# Altium footprint library PHOENIX THD.PcbLib: 109 footprints (part 7 of 8) (continued)
## PHOENIX_1803442 [mm] "PCB Header, 8A, 160 V, Pitch: 3.81mm, 4 Positions, MCV Serie" (continued)
Mechanical 14:
  drawing of 161 lines, arcs and shapes, not listed
3D body "PHOENIX_1803442.stp": height 9.2, standoff -3.4, extent -8.315,-3 8.315,4.25

## PHOENIX_1803455 [mm] "PCB Header, 8A, 160 V, Pitch: 3.81mm, 5 Positions, MCV Serie"
height 9.2
pads (5):
  round 1.9 hole 1.2: 1(-7.62,0) 2(-3.81,0) 3(0,0) 4(3.81,0) 5(7.62,0)
Top Overlay:
  drawing of 176 lines, arcs and shapes, not listed
  text "5" at 7.345,4.6 h1
  text "4" at 3.535,4.6 h1
  text "3" at -0.275,4.6 h1
  text "2" at -4.085,4.6 h1
  text "1" at -7.895,4.6 h1
Mechanical 8:
  lines w0.1: -8.12,0 -7.62,0 ; -7.62,-0.5 -7.62,0 ; -7.62,0.5 -7.62,0 ; -7.12,0 -7.62,0 ; -4.31,0 -3.81,0 ; -3.81,-0.5 -3.81,0 ; -3.81,0.5 -3.81,0 ; -3.31,0 -3.81,0 ; -0.5,0 0,0 ; 0,-0.5 0,0 ; 0,0.5 0,0 ; 0.5,0 0,0 ; 3.31,0 3.81,0 ; 3.81,-0.5 3.81,0 ; 3.81,0.5 3.81,0 ; 4.31,0 3.81,0 ; 7.12,0 7.62,0 ; 7.62,-0.5 7.62,0 ; 7.62,0.5 7.62,0 ; 8.12,0 7.62,0
Mechanical 14:
  drawing of 202 lines, arcs and shapes, not listed
3D body "PHOENIX_1803455.stp": height 9.2, standoff -3.4, extent -10.22,-3 10.22,4.25

## PHOENIX_1803468 [mm] "PCB Header, 8A, 160 V, Pitch: 3.81mm, 6 Positions, MCV Serie"
height 9.2
pads (6):
  round 1.9 hole 1.2: 1(-9.525,0) 2(-5.715,0) 3(-1.905,0) 4(1.905,0) 5(5.715,0) 6(9.525,0)
Top Overlay:
  drawing of 218 lines, arcs and shapes, not listed
  text "1" at -9.8,4.6 h1
  text "2" at -5.99,4.6 h1
  text "3" at -2.18,4.6 h1
  text "4" at 1.63,4.6 h1
  text "5" at 5.44,4.6 h1
  text "6" at 9.25,4.6 h1
Mechanical 8:
  lines w0.1: -10.025,0 -9.525,0 ; -9.525,-0.5 -9.525,0 ; -9.525,0.5 -9.525,0 ; -9.025,0 -9.525,0 ; -6.215,0 -5.715,0 ; -5.715,-0.5 -5.715,0 ; -5.715,0.5 -5.715,0 ; -5.215,0 -5.715,0 ; -2.405,0 -1.905,0 ; -1.905,-0.5 -1.905,0 ; -1.905,0.5 -1.905,0 ; -1.405,0 -1.905,0 ; -0.5,0 0,0 ; 0,-0.5 0,0 ; 0,0.5 0,0 ; 0.5,0 0,0 ; 1.405,0 1.905,0 ; 1.905,-0.5 1.905,0 ; 1.905,0.5 1.905,0 ; 2.405,0 1.905,0 ; 5.215,0 5.715,0 ; 5.715,-0.5 5.715,0 ; 5.715,0.5 5.715,0 ; 6.215,0 5.715,0 ; 9.025,0 9.525,0 ; 9.525,-0.5 9.525,0 ; 9.525,0.5 9.525,0 ; 10.025,0 9.525,0
Mechanical 14:
  drawing of 409 lines, arcs and shapes, not listed
3D body "PHOENIX_1803468.stp": height 9.2, standoff -3.4, extent -12.125,-3 12.125,4.25

## PHOENIX_1803484 [mm] "PCB Header, 8A, 160 V, Pitch: 3.81mm, 8 Positions, MCV Serie"
height 9.2
pads (8):
  round 1.9 hole 1.2: 1(-13.335,0) 2(-9.525,0) 3(-5.715,0) 4(-1.905,0) 5(1.905,0) 6(5.715,0) 7(9.525,0) 8(13.335,0)
Top Overlay:
  drawing of 290 lines, arcs and shapes, not listed
  text "8" at 13.06,4.6 h1
  text "7" at 9.25,4.6 h1
  text "1" at -13.61,4.6 h1
  text "2" at -9.8,4.6 h1
  text "3" at -5.99,4.6 h1
  text "4" at -2.18,4.6 h1
  text "5" at 1.63,4.6 h1
  text "6" at 5.44,4.6 h1
Mechanical 8:
  lines w0.1: -13.835,0 -13.335,0 ; -13.335,-0.5 -13.335,0 ; -13.335,0.5 -13.335,0 ; -12.835,0 -13.335,0 ; -10.025,0 -9.525,0 ; -9.525,-0.5 -9.525,0 ; -9.525,0.5 -9.525,0 ; -9.025,0 -9.525,0 ; -6.215,0 -5.715,0 ; -5.715,-0.5 -5.715,0 ; -5.715,0.5 -5.715,0 ; -5.215,0 -5.715,0 ; -2.405,0 -1.905,0 ; -1.905,-0.5 -1.905,0 ; -1.905,0.5 -1.905,0 ; -1.405,0 -1.905,0 ; -0.5,0 0,0 ; 0,-0.5 0,0 ; 0,0.5 0,0 ; 0.5,0 0,0 ; 1.405,0 1.905,0 ; 1.905,-0.5 1.905,0 ; 1.905,0.5 1.905,0 ; 2.405,0 1.905,0 ; 5.215,0 5.715,0 ; 5.715,-0.5 5.715,0 ; 5.715,0.5 5.715,0 ; 6.215,0 5.715,0 ; 9.025,0 9.525,0 ; 9.525,-0.5 9.525,0 ; 9.525,0.5 9.525,0 ; 10.025,0 9.525,0 ; 12.835,0 13.335,0 ; 13.335,-0.5 13.335,0 ; 13.335,0.5 13.335,0 ; 13.835,0 13.335,0
Mechanical 14:
  drawing of 492 lines, arcs and shapes, not listed
3D body "PHOENIX_1803484.stp": height 9.2, standoff -3.4, extent -15.935,-3 15.935,4.25

## PHOENIX_1804687 [mm] "PCB Header, 20A, 630V, Pitch: 7.62mm, 2 Positions, PCV Serie"
height 29
pads (4):
  round 2 hole 1.3: 1(-3.81,-3.81) 1(-3.81,3.81) 2(3.81,-3.81) 2(3.81,3.81)
Top Overlay:
  circle w0.2: c3.81,-0.01 r1.6
  lines w0.2: -5.329,5.39 -5.329,5.583 ccw(c-5.522,5.583) -5.374,5.708 -5.614,5.993 cw(c-5.466,6.118) -5.466,6.311 -2.154,6.311 cw(c-2.154,6.118) -2.006,5.993 -2.246,5.708 ccw(c-2.098,5.583) -2.291,5.583 -2.291,5.39 ; -5.26,-0.41 -5.01,-0.16 ; -5.26,0.39 -5.01,0.14 ; -5.26,6.311 -5.26,5.39 -6.91,5.39 -6.91,-3.86 -5.159,-3.86 ; -4.61,-0.41 -4.61,-1.396 ccw(c-3.81,-0.01) -4.61,1.376 -4.61,0.39 ; -2.461,-3.86 -0.435,-3.86 -0.435,5.39 -2.36,5.39 -2.36,6.311 ; -2.36,-0.41 -2.61,-0.16 ; -2.36,0.39 -2.61,0.14 ; 2.291,5.39 2.291,5.583 ccw(c2.098,5.583) 2.246,5.708 2.006,5.993 cw(c2.154,6.118) 2.154,6.311 5.466,6.311 cw(c5.466,6.118) 5.614,5.993 5.374,5.708 ccw(c5.522,5.583) 5.329,5.583 5.329,5.39 ; 2.36,-0.41 2.61,-0.16 ; 2.36,0.39 2.61,0.14 ; 2.36,6.311 2.36,5.39 0.435,5.39 0.435,-3.86 2.461,-3.86 ; 5.159,-3.86 6.91,-3.86 6.91,5.39 5.26,5.39 5.26,6.311 ; 5.26,-0.41 5.01,-0.16 ; 5.26,0.39 5.01,0.14 ; -5.01,-0.16 -5.01,0.14 ; -5.01,-0.16 -2.61,-0.16 ; -5.01,0.14 -2.61,0.14 ; -2.61,-0.16 -2.61,0.14 ; 2.61,-0.16 2.61,0.14 ; 2.61,-0.16 5.01,-0.16 ; 2.61,0.14 5.01,0.14 ; 5.01,-0.16 5.01,0.14 ; -7.61,-6.41 -7.61,7.84 7.61,7.84 7.61,-6.41 -7.61,-6.41 ; -5.31,-0.41 -5.31,0.39 -2.31,0.39 -2.31,-0.41 -5.31,-0.41 ; -0.201,-0.76 0.201,-0.76 0,-0.01 -0.201,-0.76 ; -0.201,7.004 0,6.69 0.201,7.004 -0.201,7.004 ; 2.31,-0.41 2.31,0.39 5.31,0.39 5.31,-0.41 2.31,-0.41
  text "2" at 3.535,8.41 h1
  text "1" at -4.085,8.41 h1
Mechanical 8:
  lines w0.1: -4.31,-3.81 -3.81,-3.81 ; -4.31,3.81 -3.81,3.81 ; -3.81,-4.31 -3.81,-3.81 ; -3.81,-3.31 -3.81,-3.81 ; -3.81,3.31 -3.81,3.81 ; -3.81,4.31 -3.81,3.81 ; -3.31,-3.81 -3.81,-3.81 ; -3.31,3.81 -3.81,3.81 ; -0.5,0 0,0 ; 0,-0.5 0,0 ; 0,0.5 0,0 ; 0.5,0 0,0 ; 3.31,-3.81 3.81,-3.81 ; 3.31,3.81 3.81,3.81 ; 3.81,-4.31 3.81,-3.81 ; 3.81,-3.31 3.81,-3.81 ; 3.81,3.31 3.81,3.81 ; 3.81,4.31 3.81,3.81 ; 4.31,-3.81 3.81,-3.81 ; 4.31,3.81 3.81,3.81
Mechanical 14:
  circle w0.1: c3.81,-0.01 r1.6
  lines w0.1: -5.329,5.39 -5.329,5.583 ccw(c-5.522,5.583) -5.374,5.708 -5.614,5.993 cw(c-5.466,6.118) -5.466,6.311 -2.154,6.311 cw(c-2.154,6.118) -2.006,5.993 -2.246,5.708 ccw(c-2.098,5.583) -2.291,5.583 -2.291,5.39 ; -5.26,-0.41 -5.01,-0.16 ; -5.26,0.39 -5.01,0.14 ; -5.26,6.311 -5.26,5.39 -6.91,5.39 -6.91,-3.86 -0.435,-3.86 -0.435,5.39 -2.36,5.39 -2.36,6.311 ; -4.61,-0.41 -4.61,-1.396 ccw(c-3.81,-0.01) -4.61,1.376 -4.61,0.39 ; -2.36,-0.41 -2.61,-0.16 ; -2.36,0.39 -2.61,0.14 ; 2.291,5.39 2.291,5.583 ccw(c2.098,5.583) 2.246,5.708 2.006,5.993 cw(c2.154,6.118) 2.154,6.311 5.466,6.311 cw(c5.466,6.118) 5.614,5.993 5.374,5.708 ccw(c5.522,5.583) 5.329,5.583 5.329,5.39 ; 2.36,-0.41 2.61,-0.16 ; 2.36,0.39 2.61,0.14 ; 2.36,6.311 2.36,5.39 0.435,5.39 0.435,-3.86 6.91,-3.86 6.91,5.39 5.26,5.39 5.26,6.311 ; 5.26,-0.41 5.01,-0.16 ; 5.26,0.39 5.01,0.14 ; -5.01,-0.16 -5.01,0.14 ; -5.01,-0.16 -2.61,-0.16 ; -5.01,0.14 -2.61,0.14 ; -2.61,-0.16 -2.61,0.14 ; 2.61,-0.16 2.61,0.14 ; 2.61,-0.16 5.01,-0.16 ; 2.61,0.14 5.01,0.14 ; 5.01,-0.16 5.01,0.14 ; -7.61,-6.41 -7.61,7.84 7.61,7.84 7.61,-6.41 -7.61,-6.41 ; -5.31,-0.41 -5.31,0.39 -2.31,0.39 -2.31,-0.41 -5.31,-0.41 ; -0.201,-0.76 0.201,-0.76 0,-0.01 -0.201,-0.76 ; -0.201,7.004 0,6.69 0.201,7.004 -0.201,7.004 ; 2.31,-0.41 2.31,0.39 5.31,0.39 5.31,-0.41 2.31,-0.41
  text "1" at -4.085,8.41 h1
  text "2" at 3.535,8.41 h1
3D body "PHOENIX_1804687.stp": height 29, standoff -5, extent -7.61,-6.41 7.61,7.84

## PHOENIX_1804690 [mm] "PCB Header, 20A, 630V, Pitch: 7.62mm, 3 Positions, PCV Serie"
height 29
pads (6):
  round 2 hole 1.3: 1(-7.62,-3.81) 1(-7.62,3.81) 2(0,-3.81) 2(0,3.81) 3(7.62,-3.81) 3(7.62,3.81)
Top Overlay:
  lines w0.2: -9.138,5.39 -9.138,5.584 ccw(c-9.332,5.584) -9.184,5.708 -9.424,5.993 cw(c-9.276,6.118) -9.276,6.311 -5.963,6.311 cw(c-5.963,6.118) -5.816,5.993 -6.056,5.708 ccw(c-5.908,5.584) -6.101,5.584 -6.101,5.39 ; -9.019,-3.86 -10.72,-3.86 -10.72,5.39 -9.07,5.39 -9.07,6.311 -6.17,6.311 -6.17,5.39 -4.245,5.39 -4.245,-3.86 -6.221,-3.86 ; -1.518,5.39 -1.518,5.584 ccw(c-1.712,5.584) -1.564,5.708 -1.804,5.993 cw(c-1.656,6.118) -1.656,6.311 1.657,6.311 cw(c1.657,6.118) 1.804,5.993 1.564,5.708 ccw(c1.712,5.584) 1.519,5.584 1.519,5.39 ; -1.399,-3.86 -3.375,-3.86 -3.375,5.39 -1.45,5.39 -1.45,6.311 1.45,6.311 1.45,5.39 3.375,5.39 3.375,-3.86 1.399,-3.86 ; 6.102,5.39 6.102,5.584 ccw(c5.908,5.584) 6.056,5.708 5.816,5.993 cw(c5.964,6.118) 5.964,6.311 9.277,6.311 cw(c9.277,6.118) 9.424,5.993 9.184,5.708 ccw(c9.332,5.584) 9.139,5.584 9.139,5.39 ; 6.221,-3.86 4.245,-3.86 4.245,5.39 6.17,5.39 6.17,6.311 9.07,6.311 9.07,5.39 10.72,5.39 10.72,-3.86 9.019,-3.86 ; -11.42,-6.41 -11.42,7.84 11.42,7.84 11.42,-6.41 -11.42,-6.41 ; -4.011,-0.76 -3.609,-0.76 -3.81,-0.01 -4.011,-0.76 ; 3.609,-0.76 4.011,-0.76 3.81,-0.01 3.609,-0.76
  text "1" at -7.895,8.41 h1
  text "3" at 7.345,8.41 h1
  text "2" at -0.275,8.41 h1
Mechanical 8:
  lines w0.1: -8.12,-3.81 -7.62,-3.81 ; -8.12,3.81 -7.62,3.81 ; -7.62,-4.31 -7.62,-3.81 ; -7.62,-3.31 -7.62,-3.81 ; -7.62,3.31 -7.62,3.81 ; -7.62,4.31 -7.62,3.81 ; -7.12,-3.81 -7.62,-3.81 ; -7.12,3.81 -7.62,3.81 ; -0.5,-3.81 0,-3.81 ; -0.5,0 0,0 ; -0.5,3.81 0,3.81 ; 0,-4.31 0,-3.81 ; 0,-3.31 0,-3.81 ; 0,-0.5 0,0 ; 0,0.5 0,0 ; 0,3.31 0,3.81 ; 0,4.31 0,3.81 ; 0.5,-3.81 0,-3.81 ; 0.5,0 0,0 ; 0.5,3.81 0,3.81 ; 7.12,-3.81 7.62,-3.81 ; 7.12,3.81 7.62,3.81 ; 7.62,-4.31 7.62,-3.81 ; 7.62,-3.31 7.62,-3.81 ; 7.62,3.31 7.62,3.81 ; 7.62,4.31 7.62,3.81 ; 8.12,-3.81 7.62,-3.81 ; 8.12,3.81 7.62,3.81
Mechanical 14:
  circle w0.1: c7.62,0 r1.6
  circle w0.1: c0,0 r1.6
  lines w0.1: -9.138,5.39 -9.138,5.584 ccw(c-9.332,5.584) -9.184,5.708 -9.424,5.993 cw(c-9.276,6.118) -9.276,6.311 -5.963,6.311 cw(c-5.963,6.118) -5.816,5.993 -6.056,5.708 ccw(c-5.908,5.584) -6.101,5.584 -6.101,5.39 ; -8.42,-0.41 -8.42,-1.396 ccw(c-7.62,-0.01) -8.42,1.376 -8.42,0.39 ; -1.518,5.39 -1.518,5.584 ccw(c-1.712,5.584) -1.564,5.708 -1.804,5.993 cw(c-1.656,6.118) -1.656,6.311 1.657,6.311 cw(c1.657,6.118) 1.804,5.993 1.564,5.708 ccw(c1.712,5.584) 1.519,5.584 1.519,5.39 ; 6.102,5.39 6.102,5.584 ccw(c5.908,5.584) 6.056,5.708 5.816,5.993 cw(c5.964,6.118) 5.964,6.311 9.277,6.311 cw(c9.277,6.118) 9.424,5.993 9.184,5.708 ccw(c9.332,5.584) 9.139,5.584 9.139,5.39 ; -8.42,0.39 -9.12,0.39 -9.12,-0.41 -6.12,-0.41 -6.12,0.39 -8.42,0.39 ; -11.42,-6.41 -11.42,7.84 11.42,7.84 11.42,-6.41 -11.42,-6.41 ; -10.72,-3.86 -4.245,-3.86 -4.245,5.39 -6.17,5.39 -6.17,6.311 -9.07,6.311 -9.07,5.39 -10.72,5.39 -10.72,-3.86 ; -4.011,-0.76 -3.609,-0.76 -3.81,-0.01 -4.011,-0.76 ; -3.375,-3.86 3.375,-3.86 3.375,5.39 1.45,5.39 1.45,6.311 -1.45,6.311 -1.45,5.39 -3.375,5.39 -3.375,-3.86 ; -1.5,-0.41 -1.5,0.39 -0.8,0.39 1.5,0.39 1.5,-0.41 -1.5,-0.41 ; 3.609,-0.76 4.011,-0.76 3.81,-0.01 3.609,-0.76 ; 4.245,-3.86 10.72,-3.86 10.72,5.39 9.07,5.39 9.07,6.311 6.17,6.311 6.17,5.39 4.245,5.39 4.245,-3.86 ; 6.12,-0.41 6.12,0.39 6.82,0.39 9.12,0.39 9.12,-0.41 6.12,-0.41
  text "2" at -0.275,8.41 h1
  text "3" at 7.345,8.41 h1
  text "1" at -7.895,8.41 h1
3D body "PHOENIX_1804690.stp": height 29, standoff -5, extent -11.42,-6.41 11.42,7.84

## PHOENIX_1809131 [mm] "12A, 320V, Pitch 5.08mm, 8 Positions Right Angled Header"
height 8.6
pads (8):
  round 1.9 hole 1.2: 1(-17.78,0) 2(-12.7,0) 3(-7.62,0) 4(-2.54,0) 5(2.54,0) 6(7.62,0) 7(12.7,0) 8(17.78,0)
Top Overlay:
  lines w0.2: -25.375,-7.338 -24.475,-7.337 ; -25.375,-7 -24.475,-7 ; -24.475,2 -24.475,-9 -21.72,-9 -21.72,2 ; -21.72,-7 21.72,-7 ; -21.208,-10 -20.936,-8.626 20.936,-8.626 21.208,-10 ; -18.755,-10 -18.385,-8.7 -17.175,-8.7 -16.805,-10 ; -13.675,-10 -13.305,-8.7 -12.095,-8.7 -11.725,-10 ; -8.595,-10 -8.225,-8.7 -7.015,-8.7 -6.645,-10 ; -3.515,-10 -3.145,-8.7 -1.935,-8.7 -1.565,-10 ; 1.565,-10 1.935,-8.7 3.145,-8.7 3.515,-10 ; 6.645,-10 7.015,-8.7 8.225,-8.7 8.595,-10 ; 11.725,-10 12.095,-8.7 13.305,-8.7 13.675,-10 ; 16.805,-10 17.175,-8.7 18.385,-8.7 18.755,-10 ; 21.72,2 21.72,-9 24.475,-9 24.475,2 ; 24.475,-7.338 25.375,-7.338 ; 24.475,-7 25.375,-7 ; -25.375,-10 25.375,-10 25.375,2 -25.375,2 -25.375,-10 ; -15.441,-1.05 -15.039,-1.05 -15.24,-1.8 -15.441,-1.05 ; -10.361,-1.05 -9.959,-1.05 -10.16,-1.8 -10.361,-1.05 ; -5.281,-1.05 -4.879,-1.05 -5.08,-1.8 -5.281,-1.05 ; -0.201,-1.05 0.201,-1.05 0,-1.8 -0.201,-1.05 ; 4.879,-1.05 5.281,-1.05 5.08,-1.8 4.879,-1.05 ; 9.959,-1.05 10.361,-1.05 10.16,-1.8 9.959,-1.05 ; 15.039,-1.05 15.441,-1.05 15.24,-1.8 15.039,-1.05
  text "8" at 17.5,-3 h1
  text "7" at 12.4,-3 h1
  text "6" at 7.3,-3 h1
  text "5" at 2.2,-3 h1
  text "4" at -2.9,-3 h1
  text "3" at -7.9,-3 h1
  text "2" at -13,-3 h1
  text "1" at -17.9,-3 h1
Mechanical 8:
  lines w0.05: -18.28,0 -17.78,0 ; -17.78,-0.5 -17.78,0 ; -17.78,0.5 -17.78,0 ; -17.28,0 -17.78,0 ; -13.2,0 -12.7,0 ; -12.7,-0.5 -12.7,0 ; -12.7,0.5 -12.7,0 ; -12.2,0 -12.7,0 ; -8.12,0 -7.62,0 ; -7.62,-0.5 -7.62,0 ; -7.62,0.5 -7.62,0 ; -7.12,0 -7.62,0 ; -3.04,0 -2.54,0 ; -2.54,-0.5 -2.54,0 ; -2.54,0.5 -2.54,0 ; -2.04,0 -2.54,0 ; -0.5,0 0,0 ; 0,-0.5 0,0 ; 0,0.5 0,0 ; 0.5,0 0,0 ; 2.04,0 2.54,0 ; 2.54,-0.5 2.54,0 ; 2.54,0.5 2.54,0 ; 3.04,0 2.54,0 ; 7.12,0 7.62,0 ; 7.62,-0.5 7.62,0 ; 7.62,0.5 7.62,0 ; 8.12,0 7.62,0 ; 12.2,0 12.7,0 ; 12.7,-0.5 12.7,0 ; 12.7,0.5 12.7,0 ; 13.2,0 12.7,0 ; 17.28,0 17.78,0 ; 17.78,-0.5 17.78,0 ; 17.78,0.5 17.78,0 ; 18.28,0 17.78,0
Mechanical 14:
  lines w0.1: -25.375,-7.338 -24.475,-7.337 ; -25.375,-7 -24.475,-7 ; -24.475,2 -24.475,-9 -21.72,-9 -21.72,2 ; -21.72,-7 21.72,-7 ; -21.208,-10 -20.936,-8.626 20.936,-8.626 21.208,-10 ; -18.755,-10 -18.385,-8.7 -17.175,-8.7 -16.805,-10 ; -13.675,-10 -13.305,-8.7 -12.095,-8.7 -11.725,-10 ; -8.595,-10 -8.225,-8.7 -7.015,-8.7 -6.645,-10 ; -3.515,-10 -3.145,-8.7 -1.935,-8.7 -1.565,-10 ; 1.565,-10 1.935,-8.7 3.145,-8.7 3.515,-10 ; 6.645,-10 7.015,-8.7 8.225,-8.7 8.595,-10 ; 11.725,-10 12.095,-8.7 13.305,-8.7 13.675,-10 ; 16.805,-10 17.175,-8.7 18.385,-8.7 18.755,-10 ; 21.72,2 21.72,-9 24.475,-9 24.475,2 ; 24.475,-7.338 25.375,-7.338 ; 24.475,-7 25.375,-7 ; -25.375,-10 25.375,-10 25.375,2 -25.375,2 -25.375,-10 ; -15.441,-1.05 -15.039,-1.05 -15.24,-1.8 -15.441,-1.05 ; -10.361,-1.05 -9.959,-1.05 -10.16,-1.8 -10.361,-1.05 ; -5.281,-1.05 -4.879,-1.05 -5.08,-1.8 -5.281,-1.05 ; -0.201,-1.05 0.201,-1.05 0,-1.8 -0.201,-1.05 ; 4.879,-1.05 5.281,-1.05 5.08,-1.8 4.879,-1.05 ; 9.959,-1.05 10.361,-1.05 10.16,-1.8 9.959,-1.05 ; 15.039,-1.05 15.441,-1.05 15.24,-1.8 15.039,-1.05
3D body "PHOENIX_1809131.stp": height 8.6, standoff -3.5, extent -25.375,-10 25.375,2

## PHOENIX_1809322 [mm] "12A, 320V, Pitch 5.08mm, 8 Positions Header"
height 12
pads (8):
  round 2.1 hole 1.4: 1(-17.78,0) 2(-12.7,0) 3(-7.62,0) 4(-2.54,0) 5(2.54,0) 6(7.62,0) 7(12.7,0) 8(17.78,0)
Top Overlay:
  drawing of 180 lines, arcs and shapes, not listed
  text "1" at -17.89,1.485 h1.2
  text "8" at 17.395,1.485 h1.2
Mechanical 8:
  lines w0.05: -18.28,0 -17.78,0 ; -17.78,-0.5 -17.78,0 ; -17.78,0.5 -17.78,0 ; -17.28,0 -17.78,0 ; -13.2,0 -12.7,0 ; -12.7,-0.5 -12.7,0 ; -12.7,0.5 -12.7,0 ; -12.2,0 -12.7,0 ; -8.12,0 -7.62,0 ; -7.62,-0.5 -7.62,0 ; -7.62,0.5 -7.62,0 ; -7.12,0 -7.62,0 ; -3.04,0 -2.54,0 ; -2.54,-0.5 -2.54,0 ; -2.54,0.5 -2.54,0 ; -2.04,0 -2.54,0 ; -0.5,0 0,0 ; 0,-0.5 0,0 ; 0,0.5 0,0 ; 0.5,0 0,0 ; 2.04,0 2.54,0 ; 2.54,-0.5 2.54,0 ; 2.54,0.5 2.54,0 ; 3.04,0 2.54,0 ; 7.12,0 7.62,0 ; 7.62,-0.5 7.62,0 ; 7.62,0.5 7.62,0 ; 8.12,0 7.62,0 ; 12.2,0 12.7,0 ; 12.7,-0.5 12.7,0 ; 12.7,0.5 12.7,0 ; 13.2,0 12.7,0 ; 17.28,0 17.78,0 ; 17.78,-0.5 17.78,0 ; 17.78,0.5 17.78,0 ; 18.28,0 17.78,0
Mechanical 14:
  drawing of 285 lines, arcs and shapes, not listed
  text "1" at -17.89,1.485 h1.2
  text "8" at 17.395,1.485 h1.2
3D body "PHOENIX_1809322.stp": height 12, standoff -3.9, extent -25.375,-3.8 25.375,4.8

## PHOENIX_1844210 [mm] "PHOENIX MC Serie, Pitch 3.5mm, 8A, 160V, 2 Positions Header"
height 8.1
pads (2):
  round 1.9 hole 1.2: 1(-1.75,0) 2(1.75,0)
Top Overlay:
  lines w0.2: -4.2,-4.8 4.2,-4.8 ; -2.368,1.2 -4.2,1.2 -4.2,-8 4.2,-8 4.2,1.2 2.368,1.2 ; -1.132,1.2 1.132,1.2 ; -0.201,-7.25 0,-8 0.201,-7.25 -0.201,-7.25
  text "1" at -1.767,-2.35 h1
  text "2" at 1.433,-2.35 h1
Mechanical 8:
  lines w0.1: -2.25,0 -1.75,0 ; -1.75,-0.5 -1.75,0 ; -1.75,0.5 -1.75,0 ; -1.25,0 -1.75,0 ; -0.5,0 0,0 ; 0,-0.5 0,0 ; 0,0.5 0,0 ; 0.5,0 0,0 ; 1.25,0 1.75,0 ; 1.75,-0.5 1.75,0 ; 1.75,0.5 1.75,0 ; 2.25,0 1.75,0
Mechanical 14:
  lines w0.1: -4.2,-4.8 4.2,-4.8 ; -4.2,-8 4.2,-8 4.2,1.2 -4.2,1.2 -4.2,-8 ; -0.201,-7.25 0,-8 0.201,-7.25 -0.201,-7.25
3D body "PHOENIX_1844210.stp": height 7.25, standoff -3.4, extent -4.2,-8 4.2,1.2

## PHOENIX_1861028 [mm] "COMBICON PCB Male Header, Pitch 5mm, 3 Positions, Left"
height 11
pads (3):
  round 2.1 hole 1.4: 1(5,0) 2(0,0) 3(-5,0)
Top Overlay:
  lines w0.2: -8.5,12.05 -8.5,7.995 -6.5,2.5 -6.5,-1.4 -5.539,-1.4 ; -4.461,-1.4 -0.539,-1.4 ; -3.87,3.5 6.5,3.5 ; -1.4,5.05 -1.4,6.05 1.4,6.05 1.4,5.05 ; -0.7,3.5 -0.7,2.5 -0.5,2.7 ; -0.5,1.414 -0.5,3.5 ; -0.5,2.5 -3.57,2.5 cw(c-3.57,2.8) -3.87,2.8 -3.87,12.05 -9.48,12.05 -10,12.35 -10,13.25 -2.5,13.25 -2.2,12.13 -2.2,5.05 3.093,5.05 3.093,12.087 3.405,13.25 4.2,13.25 4.7,11.876 4.7,10.25 3.8,10.25 3.8,2.8 cw(c3.5,2.8) 3.5,2.5 0.5,2.5 ; -0.5,6.05 -0.5,11.05 ; 0.5,1.414 0.5,3.5 ; 0.5,2.7 0.7,2.5 0.7,3.5 ; 0.5,6.05 0.5,11.05 ; 0.539,-1.4 4.3,-1.4 ; 1.414,-0.5 3.586,-0.5 ; 1.414,0.5 3.586,0.5 ; 3.8,5.15 5.3,5.15 5.3,5.85 ; 3.8,6.15 4.78,6.15 6.5,5.157 6.5,-1.4 5.7,-1.4 ; 3.8,7.15 4.78,7.15 5.3,7.45 5.3,8.15 3.8,8.15 ; 4.3,-1.327 4.3,-1.4 ; 4.349,-1.351 4.3,-1.4 ; 5.651,-1.351 5.7,-1.4 ; 5.7,-1.327 5.7,-1.4 ; -0.5,11.05 0.5,11.05 ; -0.5,11.05 -0.232,12.05 0.232,12.05 0.5,11.05 ; 4.75,-2.1 5.25,-2.1 5,-1.6 4.75,-2.1
Mechanical 8:
  lines w0.1: -6,0 -5,0 -5,1 ; -1,0 0,0 0,1 ; 4,0 5,0 5,1
Mechanical 14:
  lines w0.1: -8.5,12.05 -8.5,7.995 -6.5,2.5 -6.5,-1.4 4.3,-1.4 ; -3.87,3.5 6.5,3.5 ; -1.4,5.05 -1.4,6.05 1.4,6.05 1.4,5.05 ; -0.7,3.5 -0.7,2.5 -0.5,2.7 ; -0.5,2.5 -3.57,2.5 cw(c-3.57,2.8) -3.87,2.8 -3.87,12.05 -9.48,12.05 -10,12.35 -10,13.25 -2.5,13.25 -2.2,12.13 -2.2,5.05 3.093,5.05 3.093,12.087 3.405,13.25 4.2,13.25 4.7,11.876 4.7,10.25 3.8,10.25 3.8,2.8 cw(c3.5,2.8) 3.5,2.5 0.5,2.5 ; -0.5,3.5 -0.5,0.7 ccw(c0.7,0.7) 0.7,-0.5 5.5,-0.5 ; -0.5,6.05 -0.5,11.05 ; 0.5,2.7 0.7,2.5 0.7,3.5 ; 0.5,3.5 0.5,0.7 ccw(c0.7,0.7) 0.7,0.5 5.5,0.5 ; 0.5,6.05 0.5,11.05 ; 3.8,5.15 5.3,5.15 5.3,5.85 ; 3.8,6.15 4.78,6.15 6.5,5.157 6.5,-1.4 5.7,-1.4 ; 3.8,7.15 4.78,7.15 5.3,7.45 5.3,8.15 3.8,8.15 ; 4.5,-0.5 4.5,-1.2 4.3,-1.4 ; 4.5,0.5 4.3,0.7 ; -0.5,11.05 0.5,11.05 ; -0.5,11.05 -0.232,12.05 0.232,12.05 0.5,11.05 ; 4.3,-1.4 4.3,0.7 ; 4.3,0.7 5.7,0.7 ; 5.5,0.5 5.5,-1.2 5.7,-1.4 ; 5.5,0.5 5.7,0.7 ; 5.7,-1.4 5.7,0.7
3D body "PHOENIX_1861028.stp": height 10.97, standoff -3.98, extent -10,-1.4 6.5,13.25

## PHOENIX_1861031 [mm] "COMBICON PCB Male Header, Pitch 5mm, 3 Positions, Right"
height 11
pads (3):
  round 2.1 hole 1.4: 5(-5,0) 6(0,0) 7(5,0)
Top Overlay:
  lines w0.2: -6.5,3.5 3.87,3.5 ; -5.539,-1.4 -6.5,-1.4 -6.5,5.157 -4.78,6.15 -3.8,6.15 ; -5.3,5.85 -5.3,5.15 -3.8,5.15 ; -4.461,-1.4 -0.539,-1.4 ; -3.8,7.15 -4.78,7.15 -5.3,7.45 -5.3,8.15 -3.8,8.15 ; -1.4,5.05 -1.4,6.05 1.4,6.05 1.4,5.05 ; -1.212,5.05 -1.212,6.05 ; -0.7,3.5 -0.7,2.5 -0.5,2.7 ; -0.5,1.414 -0.5,3.5 ; -0.5,2.5 -3.5,2.5 cw(c-3.5,2.8) -3.8,2.8 -3.8,10.25 -4.7,10.25 -4.7,11.876 -4.2,13.25 -3.405,13.25 -3.093,12.087 -3.093,5.05 2.2,5.05 2.2,12.13 2.5,13.25 10,13.25 10,12.35 9.48,12.05 3.87,12.05 3.87,2.8 cw(c3.57,2.8) 3.57,2.5 0.5,2.5 ; -0.5,6.05 -0.5,11.05 ; 0.5,1.414 0.5,3.5 ; 0.5,2.7 0.7,2.5 0.7,3.5 ; 0.5,6.05 0.5,11.05 ; 0.539,-1.4 4.3,-1.4 ; 1.212,5.05 1.212,6.05 ; 1.414,-0.5 3.586,-0.5 ; 1.414,0.5 3.586,0.5 ; 4.3,-1.327 4.3,-1.4 ; 4.349,-1.351 4.3,-1.4 ; 5.651,-1.351 5.7,-1.4 ; 5.7,-1.327 5.7,-1.4 ; 8.5,12.05 8.5,7.995 6.5,2.5 6.5,-1.4 5.7,-1.4 ; -0.5,11.05 -0.232,12.05 0.232,12.05 0.5,11.05 ; -0.5,11.05 0.5,11.05 ; -5.25,-2.1 -5,-1.6 -4.75,-2.1 -5.25,-2.1 ; -0.201,4.3 0,5.05 0.201,4.3 -0.201,4.3
Mechanical 8:
  lines w0.1: -5,-1 -5,0 -4,0 ; 0,-1 0,0 1,0 ; 5,-1 5,0 6,0
Mechanical 14:
  lines w0.1: -6.5,3.5 3.87,3.5 ; -5.3,5.85 -5.3,5.15 -3.8,5.15 ; -3.8,6.15 -4.78,6.15 -6.5,5.157 -6.5,-1.4 4.3,-1.4 ; -3.8,7.15 -4.78,7.15 -5.3,7.45 -5.3,8.15 -3.8,8.15 ; -1.4,5.05 -1.4,6.05 1.4,6.05 1.4,5.05 ; -1.212,5.05 -1.212,6.05 ; -0.7,3.5 -0.7,2.5 -0.5,2.7 ; -0.5,2.5 -3.5,2.5 cw(c-3.5,2.8) -3.8,2.8 -3.8,10.25 -4.7,10.25 -4.7,11.876 -4.2,13.25 -3.405,13.25 -3.093,12.087 -3.093,5.05 2.2,5.05 2.2,12.13 2.5,13.25 10,13.25 10,12.35 9.48,12.05 3.87,12.05 3.87,2.8 cw(c3.57,2.8) 3.57,2.5 0.5,2.5 ; -0.5,3.5 -0.5,0.7 ccw(c0.7,0.7) 0.7,-0.5 5.5,-0.5 ; -0.5,6.05 -0.5,11.05 ; 0.5,2.7 0.7,2.5 0.7,3.5 ; 0.5,3.5 0.5,0.7 ccw(c0.7,0.7) 0.7,0.5 5.5,0.5 ; 0.5,6.05 0.5,11.05 ; 1.212,5.05 1.212,6.05 ; 4.5,-0.5 4.5,-1.2 4.3,-1.4 ; 4.5,0.5 4.3,0.7 ; 8.5,12.05 8.5,7.995 6.5,2.5 6.5,-1.4 5.7,-1.4 ; -0.5,11.05 -0.232,12.05 0.232,12.05 0.5,11.05 ; -0.5,11.05 0.5,11.05 ; 4.3,-1.4 4.3,0.7 ; 4.3,0.7 5.7,0.7 ; 5.5,0.5 5.7,0.7 ; 5.5,0.5 5.5,-1.2 5.7,-1.4 ; 5.7,-1.4 5.7,0.7 ; -0.201,4.3 0,5.05 0.201,4.3 -0.201,4.3
3D body "PHOENIX_1861031.stp": height 10.97, standoff -3.98, extent -6.5,-1.4 10,13.25